# Altium footprint library Hydra_Ref_pcb.PcbLib: 353 footprints (part 6 of 23)
Each footprint in its own frame and in the unit in brackets; x right, y up, seen from the top. Pads: shape width x height; smd on the part's side, far side on the other; paste and mask are expansions set on the pad; w line width, h text height; cw(c..) or ccw(c..) is an arc to the next point about the centre after c.
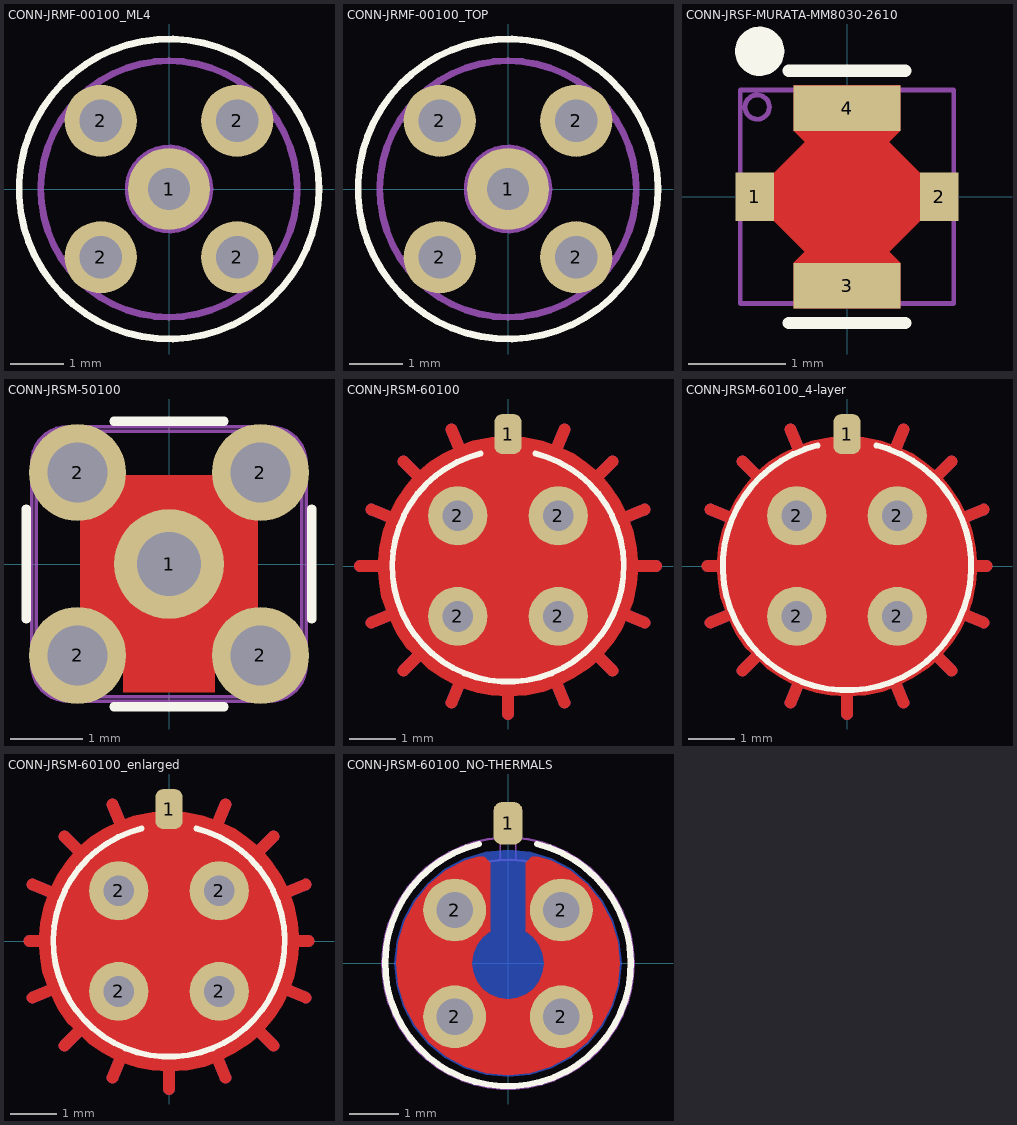
[diagram p5: the footprints below, top view; thin cyan lines are the x and y axes]

## CONN-JRMF-00100_ML4 [mil] "Straight PCB jack receptacle (MidLayer 4 routing)"
height 236.22
pads (5):
  round 60 / inner round 0 / far side round 60 hole 31 paste+0 mask+70: 1(0,0)
  round 53 / inner round 45 / far side oval 53x68 hole 31: 2(-50,-50) 2(-50,50) 2(50,-50) 2(50,50)
Top Overlay:
  circle w5: c0,0 r110
Internal Plane 1:
  lines w10: -78.28,-61.43 ccw(c-50,-50) -61.43,-78.28 ; -78.28,-38.57 cw(c-50,-50) -61.43,-21.72 ; -78.28,38.57 ccw(c-50,50) -61.43,21.72 ; -78.28,61.43 cw(c-50,50) -61.43,78.28 ; -38.57,-78.28 ccw(c-50,-50) -21.72,-61.43 ; -38.57,-21.72 cw(c-50,-50) -21.72,-38.57 ; -38.57,21.72 ccw(c-50,50) -21.72,38.57 ; -38.57,78.28 cw(c-50,50) -21.72,61.43 ; 21.72,-61.43 ccw(c50,-50) 38.57,-78.28 ; 21.72,-38.57 cw(c50,-50) 38.57,-21.72 ; 21.72,38.57 ccw(c50,50) 38.57,21.72 ; 21.72,61.43 cw(c50,50) 38.57,78.28 ; 61.43,-78.28 ccw(c50,-50) 78.28,-61.43 ; 61.43,-21.72 cw(c50,-50) 78.28,-38.57 ; 61.43,21.72 ccw(c50,50) 78.28,38.57 ; 61.43,78.28 cw(c50,50) 78.28,61.43
InternalPlane 3:
  lines w10: -78.28,-61.43 ccw(c-50,-50) -61.43,-78.28 ; -78.28,-38.57 cw(c-50,-50) -61.43,-21.72 ; -78.28,38.57 ccw(c-50,50) -61.43,21.72 ; -78.28,61.43 cw(c-50,50) -61.43,78.28 ; -38.57,-78.28 ccw(c-50,-50) -21.72,-61.43 ; -38.57,-21.72 cw(c-50,-50) -21.72,-38.57 ; -38.57,21.72 ccw(c-50,50) -21.72,38.57 ; -38.57,78.28 cw(c-50,50) -21.72,61.43 ; 21.72,-61.43 ccw(c50,-50) 38.57,-78.28 ; 21.72,-38.57 cw(c50,-50) 38.57,-21.72 ; 21.72,38.57 ccw(c50,50) 38.57,21.72 ; 21.72,61.43 cw(c50,50) 38.57,78.28 ; 61.43,-78.28 ccw(c50,-50) 78.28,-61.43 ; 61.43,-21.72 cw(c50,-50) 78.28,-38.57 ; 61.43,21.72 ccw(c50,50) 78.28,38.57 ; 61.43,78.28 cw(c50,50) 78.28,61.43
Internal Plane 4:
  lines w10: -78.28,-61.43 ccw(c-50,-50) -61.43,-78.28 ; -78.28,-38.57 cw(c-50,-50) -61.43,-21.72 ; -78.28,38.57 ccw(c-50,50) -61.43,21.72 ; -78.28,61.43 cw(c-50,50) -61.43,78.28 ; -38.57,-78.28 ccw(c-50,-50) -21.72,-61.43 ; -38.57,-21.72 cw(c-50,-50) -21.72,-38.57 ; -38.57,21.72 ccw(c-50,50) -21.72,38.57 ; -38.57,78.28 cw(c-50,50) -21.72,61.43 ; 21.72,-61.43 ccw(c50,-50) 38.57,-78.28 ; 21.72,-38.57 cw(c50,-50) 38.57,-21.72 ; 21.72,38.57 ccw(c50,50) 38.57,21.72 ; 21.72,61.43 cw(c50,50) 38.57,78.28 ; 61.43,-78.28 ccw(c50,-50) 78.28,-61.43 ; 61.43,-21.72 cw(c50,-50) 78.28,-38.57 ; 61.43,21.72 ccw(c50,50) 78.28,38.57 ; 61.43,78.28 cw(c50,50) 78.28,61.43
9 Top Assy:
  circle w5: c0,0 r94
  circle w5: c0,0 r30
  text ".Designator" at -85,110 h20
3D body: height 20, standoff 0, extent 30.16,-69.96 70.01,-30.03
3D body: height 20, standoff 0, extent -69.84,-69.96 -29.99,-30.03
3D body: height 20, standoff 0, extent 30.16,30.04 70.01,69.97
3D body: height 20, standoff 0, extent -69.84,30.04 -29.99,69.97
3D body: height 221, standoff 20, extent -94,-94 94,94

## CONN-JRMF-00100_TOP [mil] "Straight PCB jack receptacle - TOP routing"
height 236.22
pads (5):
  round 60 hole 31 paste+0 mask+70: 1(0,0)
  round 53 / inner round 45 / far side oval 53x68 hole 31: 2(-50,-50) 2(-50,50) 2(50,-50) 2(50,50)
Top Overlay:
  circle w5: c0,0 r110
InternalPlane 3:
  lines w10: -78.28,-61.43 ccw(c-50,-50) -61.43,-78.28 ; -78.28,-38.57 cw(c-50,-50) -61.43,-21.72 ; -78.28,38.57 ccw(c-50,50) -61.43,21.72 ; -78.28,61.43 cw(c-50,50) -61.43,78.28 ; -38.57,-78.28 ccw(c-50,-50) -21.72,-61.43 ; -38.57,-21.72 cw(c-50,-50) -21.72,-38.57 ; -38.57,21.72 ccw(c-50,50) -21.72,38.57 ; -38.57,78.28 cw(c-50,50) -21.72,61.43 ; 21.72,-61.43 ccw(c50,-50) 38.57,-78.28 ; 21.72,-38.57 cw(c50,-50) 38.57,-21.72 ; 21.72,38.57 ccw(c50,50) 38.57,21.72 ; 21.72,61.43 cw(c50,50) 38.57,78.28 ; 61.43,-78.28 ccw(c50,-50) 78.28,-61.43 ; 61.43,-21.72 cw(c50,-50) 78.28,-38.57 ; 61.43,21.72 ccw(c50,50) 78.28,38.57 ; 61.43,78.28 cw(c50,50) 78.28,61.43
Internal Plane 2:
  lines w10: -78.28,-61.43 ccw(c-50,-50) -61.43,-78.28 ; -78.28,-38.57 cw(c-50,-50) -61.43,-21.72 ; -78.28,38.57 ccw(c-50,50) -61.43,21.72 ; -78.28,61.43 cw(c-50,50) -61.43,78.28 ; -38.57,-78.28 ccw(c-50,-50) -21.72,-61.43 ; -38.57,-21.72 cw(c-50,-50) -21.72,-38.57 ; -38.57,21.72 ccw(c-50,50) -21.72,38.57 ; -38.57,78.28 cw(c-50,50) -21.72,61.43 ; 21.72,-61.43 ccw(c50,-50) 38.57,-78.28 ; 21.72,-38.57 cw(c50,-50) 38.57,-21.72 ; 21.72,38.57 ccw(c50,50) 38.57,21.72 ; 21.72,61.43 cw(c50,50) 38.57,78.28 ; 61.43,-78.28 ccw(c50,-50) 78.28,-61.43 ; 61.43,-21.72 cw(c50,-50) 78.28,-38.57 ; 61.43,21.72 ccw(c50,50) 78.28,38.57 ; 61.43,78.28 cw(c50,50) 78.28,61.43
Internal Plane 4:
  lines w10: -78.28,-61.43 ccw(c-50,-50) -61.43,-78.28 ; -78.28,-38.57 cw(c-50,-50) -61.43,-21.72 ; -78.28,38.57 ccw(c-50,50) -61.43,21.72 ; -78.28,61.43 cw(c-50,50) -61.43,78.28 ; -38.57,-78.28 ccw(c-50,-50) -21.72,-61.43 ; -38.57,-21.72 cw(c-50,-50) -21.72,-38.57 ; -38.57,21.72 ccw(c-50,50) -21.72,38.57 ; -38.57,78.28 cw(c-50,50) -21.72,61.43 ; 21.72,-61.43 ccw(c50,-50) 38.57,-78.28 ; 21.72,-38.57 cw(c50,-50) 38.57,-21.72 ; 21.72,38.57 ccw(c50,50) 38.57,21.72 ; 21.72,61.43 cw(c50,50) 38.57,78.28 ; 61.43,-78.28 ccw(c50,-50) 78.28,-61.43 ; 61.43,-21.72 cw(c50,-50) 78.28,-38.57 ; 61.43,21.72 ccw(c50,50) 78.28,38.57 ; 61.43,78.28 cw(c50,50) 78.28,61.43
9 Top Assy:
  circle w5: c0,0 r94
  circle w5: c0,0 r30
  text ".Designator" at -85,110 h20
3D body: height 20, standoff 0, extent 30.16,-69.96 70.01,-30.03
3D body: height 20, standoff 0, extent -69.84,-69.96 -29.99,-30.03
3D body: height 20, standoff 0, extent 30.16,30.04 70.01,69.97
3D body: height 20, standoff 0, extent -69.84,30.04 -29.99,69.97
3D body: height 221, standoff 20, extent -94,-94 94,94

## CONN-JRSF-MURATA-MM8030-2610 [mm] "SWG Type F SMT receptacle, integrated SPST switch"
height 0.9
pads (4):
  rect 0.4x0.5 smd paste-0.5 mask+0: 1(-0.95,0) 2(0.95,0)
  rect 1.1x0.47 smd paste-0.6 mask+0: 3(0,-0.915) 4(0,0.915)
Top Layer:
  region: 0.32,-1.15 0.32,1.15 -0.32,1.15 -0.32,-1.15
  pour cut-out: -0.75,-0.25 -0.45,-0.55 -0.425,-0.575 0.425,-0.575 0.75,-0.25 0.75,0.25 0.425,0.575 -0.425,0.575 -0.75,0.25
  region: -0.55,-1.15 -0.55,-0.68 -0.32,-0.45 0.32,-0.45 0.55,-0.68 0.55,-1.15
  region: 0.55,1.15 0.55,0.68 0.32,0.45 -0.32,0.45 -0.55,0.68 -0.55,1.15
Top Overlay:
  circle w0.254: c-0.9,1.5 r0.127
  lines w0.127: -0.6,-1.3 0.6,-1.3 ; -0.6,1.3 0.6,1.3
Top Paste:
  region: -0.5,1.15 -0.5,0.65 0.5,0.65 0.5,1.15
  region: 0.5,-1.15 0.5,-0.65 -0.5,-0.65 -0.5,-1.15
  region: 0.8,0.175 0.8,-0.175 1.15,-0.175 1.15,0.175
  region: -0.8,-0.175 -0.8,0.175 -1.15,0.175 -1.15,-0.175
9 Top Assy:
  circle w0.051: c-0.925,0.925 r0.125
  lines w0.051: -1.1,-1.1 -1.1,1.1 1.1,1.1 1.1,-1.1 -1.1,-1.1
  text ".Designator" at -0.95,-0.169 h0.51
3D body: height 0.47, standoff 0, extent -1.1,-1.1 1.1,1.1
3D body: height 0.99, standoff 0.54, extent -0.67,-0.674 0.675,0.674
3D body: height 1, standoff 0.99, extent -0.595,-0.599 0.6,0.599
3D body: height 0.48, standoff 0.47, extent -1.049,0.801 -0.801,1.049

## CONN-JRSM-50100 [mil] ".094 PCB-MALE"
height 194
pads (5):
  round 60 hole 35 paste-30: 1(0,0)
  round 53 / inner round 53 / far side oval 53x68 hole 33: 2(-50,-50) 2(-50,50) 2(50,-50) 2(50,50)
Top Layer:
  pour cut-out: 25,-70 25,48.41 -25,48.41 -25,-70
  pour cut-out: -48.41,-25 48.41,-25 48.41,25 -48.41,25
  pour cut-out: 0,48 4.73,48 14,46.16 22.74,42.54 30.6,37.28 37.28,30.6 42.54,22.74 46.16,14 48,4.73 48,0 48,-2 48,-6.73 46.16,-16 42.54,-24.74 37.28,-32.6 30.6,-39.28 22.74,-44.54 14,-48.16 4.73,-50 0,-50 -4.73,-50 -14,-48.16 -22.74,-44.54 -30.6,-39.28 -37.28,-32.6 -42.54,-24.74 -46.16,-16 -48,-6.73 -48,-2 -48,0 -48,4.73 -46.16,14 -42.54,22.74 -37.28,30.6 -30.6,37.28 -22.74,42.54 -14,46.16 -4.73,48
Mid-Layer 1:
  pour cut-out: -48.41,-25 48.41,-25 48.41,25 -48.41,25
  pour cut-out: 25,-50.41 25,48.41 -25,48.41 -25,-50.41
  pour cut-out: 0,48 4.73,48 14,46.16 22.74,42.54 30.6,37.28 37.28,30.6 42.54,22.74 46.16,14 48,4.73 48,0 48,-2 48,-6.73 46.16,-16 42.54,-24.74 37.28,-32.6 30.6,-39.28 22.74,-44.54 14,-48.16 4.73,-50 0,-50 -4.73,-50 -14,-48.16 -22.74,-44.54 -30.6,-39.28 -37.28,-32.6 -42.54,-24.74 -46.16,-16 -48,-6.73 -48,-2 -48,0 -48,4.73 -46.16,14 -42.54,22.74 -37.28,30.6 -30.6,37.28 -22.74,42.54 -14,46.16 -4.73,48
MidLayer3:
  pour cut-out: -48.41,-25 48.21,-25 48.21,25 -48.41,25
  pour cut-out: 25,-50.41 25,48.41 -25,48.41 -25,-50.41
  pour cut-out: 0,48 4.73,48 14,46.16 22.74,42.54 30.6,37.28 37.28,30.6 42.54,22.74 46.16,14 48,4.73 48,0 48,-2 48,-6.73 46.16,-16 42.54,-24.74 37.28,-32.6 30.6,-39.28 22.74,-44.54 14,-48.16 4.73,-50 0,-50 -4.73,-50 -14,-48.16 -22.74,-44.54 -30.6,-39.28 -37.28,-32.6 -42.54,-24.74 -46.16,-16 -48,-6.73 -48,-2 -48,0 -48,4.73 -46.16,14 -42.54,22.74 -37.28,30.6 -30.6,37.28 -22.74,42.54 -14,46.16 -4.73,48
MidLayer2:
  pour cut-out: -48.41,-18 48,-18 48,25 -48.41,25
  pour cut-out: 25,-50.41 25,48.41 -25,48.41 -25,-50.41
  pour cut-out: 0,48 4.73,48 14,46.16 22.74,42.54 30.6,37.28 37.28,30.6 42.54,22.74 46.16,14 48,4.73 48,0 48,-2 48,-6.73 46.16,-16 42.54,-24.74 37.28,-32.6 30.6,-39.28 22.74,-44.54 14,-48.16 4.73,-50 0,-50 -4.73,-50 -14,-48.16 -22.74,-44.54 -30.6,-39.28 -37.28,-32.6 -42.54,-24.74 -46.16,-16 -48,-6.73 -48,-2 -48,0 -48,4.73 -46.16,14 -42.54,22.74 -37.28,30.6 -30.6,37.28 -22.74,42.54 -14,46.16 -4.73,48
Bottom Layer:
  pour cut-out: -48.41,-18 48.21,-18 48.21,18 -48.41,18
  pour cut-out: 25,-50.41 25,48.41 -25,48.41 -25,-50.41
  pour cut-out: 0,48 4.73,48 14,46.16 22.74,42.54 30.6,37.28 37.28,30.6 42.54,22.74 46.16,14 48,4.73 48,0 48,-2 48,-6.73 46.16,-16 42.54,-24.74 37.28,-32.6 30.6,-39.28 22.74,-44.54 14,-48.16 4.73,-50 0,-50 -4.73,-50 -14,-48.16 -22.74,-44.54 -30.6,-39.28 -37.28,-32.6 -42.54,-24.74 -46.16,-16 -48,-6.73 -48,-2 -48,0 -48,4.73 -46.16,14 -42.54,22.74 -37.28,30.6 -30.6,37.28 -22.74,42.54 -14,46.16 -4.73,48
Top Overlay:
  lines w5: -78,-30 -78,30 ; -30,-78 30,-78 ; -30,78 30,78 ; 78,-30 78,30
Top Solder:
  rectangle: -82,-82 82,82
9 Top Assy:
  lines w2: -75,-55 ccw(c-55,-55) -55,-75 55,-75 ccw(c55,-55) 75,-55 75,55 ccw(c55,55) 55,75 -55.5,75 ccw(c-55.5,55.5) -75,55.5 -75,-55
  text ".Designator" at -65,-15 h38
13 Top 3D Bodies:
  lines w2: -72.5,-60 -72.5,60 -60,72.5 60,72.5 72.5,60 72.5,-60 60,-72.5 -60,-72.5 -72.5,-60
3D body: height 194, standoff 0, extent -72.5,-72.5 72.5,72.5
3D body: height 0, standoff -96, extent -59.98,40.02 -40.02,59.98
3D body: height 0, standoff -96, extent 40.02,40.02 59.98,59.98
3D body: height 0, standoff -96, extent -59.98,-59.98 -40.02,-40.02
3D body: height 0, standoff -96, extent 40.02,-59.98 59.98,-40.02
3D body: height 0, standoff -96, extent -11.98,-11.98 11.98,11.98

## CONN-JRSM-60100 [mil] ".063\" PCB ONLY-MALE COMPANAR SURFACE MOUNT"
height 150
pads (5):
  rrect60% 23x34 smd paste+0: 1(0,111.5)
  round 50 / inner round 50 / far side round 60 hole 26: 2(-42.5,-42.5) 2(-42.5,42.5) 2(42.5,-42.5) 2(42.5,42.5)
Top Layer:
  pour cut-out: 0,110 14,109 29,106 42,101.4 56,95 67,87 78,78 87,67 95,55 101.4,42 106,30 109,15 110,0 109,-15 106,-30 101.4,-42 96,-54 89,-65 78,-78 69,-86 55,-95 42,-101.4 30,-106 16,-109 0,-110 -14,-109 -26,-107 -42.25,-102 -57,-94 -67,-87 -77,-77 -86,-69 -94,-57 -101.4,-42 -107,-26 -109,-14 -110,0 -109,15 -106,29 -101.4,42 -95,55 -87,67 -78,78 -66,88 -55,95 -42,101.4 -30,106 -14,109
  region: -14,80 -19,85 -24,85 -34,82.08 -49.47,74.04 -62.96,62.96 -74.04,49.47 -82.26,34.08 -87.33,17.37 -89.04,0 -87.33,-17.37 -82.26,-34.08 -74.04,-49.47 -62.96,-62.96 -49.47,-74.04 -34.08,-82.26 -17.37,-87.33 0,-89.04 17.37,-87.33 34.08,-82.26 49.47,-74.04 62.96,-62.96 74.04,-49.47 82.26,-34.08 87.33,-17.37 89.04,0 87.33,17.37 82.26,34.08 74.04,49.47 62.96,62.96 49.47,74.04 34,82.08 24,85 19,85 14,80 14,25 20.32,20.51 24.88,14.56 27,8 28.73,0.2 27.75,-7.23 24.88,-14.16 20.32,-20.11 14.37,-24.68 7.44,-27.55 0,-28.53 -7.43,-27.55 -14.36,-24.68 -20.31,-20.11 -24.87,-14.16 -27.74,-7.23 -28.72,0.2 -27.74,7.63 -24.87,14.56 -20.31,20.51 -14,25
  region: 14,80 25,97 38.11,92 51,86 61,79 71,71 79,62 86,51 92,38.11 96,28 99,13 101,0 100,-12 97,-26 93,-38.52 87,-50 79,-61 71,-71 61,-79 52,-85 38.11,-92 26,-96 14,-99 0,-100 -13,-99 -25,-97 -38.52,-93 -49,-87 -60,-80 -71,-71 -79,-61 -87,-50 -92,-38.11 -97,-25 -99,-12 -100,0 -99,13 -97,25 -93,38.52 -87,49 -80,60 -71,71 -61,79 -49,87 -38.11,92 -25,97 -14,80 -14.1,25.18 -20.31,20.51 -24.87,14.56 -27.74,7.63 -28.72,0.2 -27.74,-7.23 -24.87,-14.16 -20.31,-20.11 -14.36,-24.68 -7.43,-27.55 0,-28.53 7.44,-27.55 14.37,-24.68 21,-20 24.88,-14.16 27.75,-7.23 28.73,0.2 27,8 24.88,14.56 20.32,20.51 14,25
  lines w10: -125,0 -56.21,0 ; -115.48,-47.84 -51.93,-21.51 ; -115.48,47.84 -51.93,21.51 ; -88.39,-88.39 -39.75,-39.75 ; -88.39,88.39 -39.75,39.75 ; -47.84,-115.48 -21.51,-51.93 ; -47.84,115.48 -21.51,51.93 ; 0,-125 0,-56.21 ; 21.51,-51.93 47.84,-115.48 ; 21.51,51.93 47.84,115.48 ; 39.75,-39.75 88.39,-88.39 ; 39.75,39.75 88.39,88.39 ; 51.93,-21.51 115.48,-47.84 ; 51.93,21.51 115.48,47.84 ; 56.21,0 125,0
Mid-Layer 1:
  pour cut-out: 98.9,0 97,-19.3 91.37,-37.85 82.23,-54.95 69.93,-69.94 54.94,-82.25 37.84,-91.39 19.28,-97.02 -0.01,-98.92 -19.31,-97.02 -37.87,-91.39 -54.97,-82.25 -69.96,-69.94 -82.26,-54.95 -91.4,-37.85 -97.03,-19.3 -98.93,0 -97.03,19.3 -91.4,37.85 -82.26,54.95 -69.96,69.94 -54.97,82.25 -37.87,91.39 -19.31,97.02 -0.01,98.92 19.28,97.02 37.84,91.39 54.94,82.25 69.93,69.94 82.23,54.95 91.37,37.85 97,19.3
  region: 0,90.44 -17.64,88.7 -34.61,83.55 -50.24,75.19 -63.95,63.95 -75.19,50.24 -83.55,34.61 -88.7,17.64 -90.44,0 -88.7,-17.64 -83.55,-34.61 -75.19,-50.24 -63.95,-63.95 -50.24,-75.19 -34.61,-83.55 -17.64,-88.7 0,-90.44 17.64,-88.7 34.61,-83.55 50.24,-75.19 63.95,-63.95 75.19,-50.24 83.55,-34.61 88.7,-17.64 90.44,0 88.7,17.64 83.55,34.61 75.19,50.24 63.95,63.95 50.24,75.19 34.61,83.55 17.64,88.7
  lines w10: -125,0 -56.21,0 ; -115.48,-47.84 -51.93,-21.51 ; -115.48,47.84 -51.93,21.51 ; -88.39,-88.39 -39.75,-39.75 ; -88.39,88.39 -39.75,39.75 ; -47.84,-115.48 -21.51,-51.93 ; -47.84,115.48 -21.51,51.93 ; 0,-125 0,-56.21 ; 0,60.1 0,112.2 ; 21.51,-51.93 47.84,-115.48 ; 21.51,51.93 47.84,115.48 ; 39.75,-39.75 88.39,-88.39 ; 39.75,39.75 88.39,88.39 ; 51.93,-21.51 115.48,-47.84 ; 51.93,21.51 115.48,47.84 ; 56.21,0 125,0
MidLayer3:
  pour cut-out: 98.9,0 97,-19.3 91.37,-37.85 82.23,-54.95 69.93,-69.94 54.94,-82.25 37.84,-91.39 19.28,-97.02 -0.01,-98.92 -19.31,-97.02 -37.87,-91.39 -54.97,-82.25 -69.96,-69.94 -82.26,-54.95 -91.4,-37.85 -97.03,-19.3 -98.93,0 -97.03,19.3 -91.4,37.85 -82.26,54.95 -69.96,69.94 -54.97,82.25 -37.87,91.39 -19.31,97.02 -0.01,98.92 19.28,97.02 37.84,91.39 54.94,82.25 69.93,69.94 82.23,54.95 91.37,37.85 97,19.3
  region: -14.03,87.66 -17.37,87.33 -34.08,82.26 -49.47,74.04 -62.96,62.96 -74.04,49.47 -82.26,34.08 -87.33,17.37 -89.04,0 -87.33,-17.37 -82.26,-34.08 -74.04,-49.47 -62.96,-62.96 -49.47,-74.04 -34.08,-82.26 -17.37,-87.33 0,-89.04 17.37,-87.33 34.08,-82.26 49.47,-74.04 62.96,-62.96 74.04,-49.47 82.26,-34.08 87.33,-17.37 89.04,0 87.33,17.37 82.26,34.08 74.04,49.47 62.96,62.96 49.47,74.04 34.08,82.26 17.37,87.33 14.03,87.66 14,87.5 14,25 14.11,25.18 14.37,25.08 20.32,20.51 24.88,14.56 27.75,7.63 28.73,0.2 27.75,-7.23 24.88,-14.16 20.32,-20.11 14.37,-24.68 7.44,-27.55 0,-28.53 -7.43,-27.55 -14.36,-24.68 -20.31,-20.11 -24.87,-14.16 -27.74,-7.23 -28.72,0.2 -27.74,7.63 -24.87,14.56 -20.31,20.51 -14.36,25.08 -14.1,25.18 -14,25
  region: 0,90.44 -17.64,88.7 -34.61,83.55 -50.24,75.19 -63.95,63.95 -75.19,50.24 -83.55,34.61 -88.7,17.64 -90.44,0 -88.7,-17.64 -83.55,-34.61 -75.19,-50.24 -63.95,-63.95 -50.24,-75.19 -34.61,-83.55 -17.64,-88.7 0,-90.44 17.64,-88.7 34.61,-83.55 50.24,-75.19 63.95,-63.95 75.19,-50.24 83.55,-34.61 88.7,-17.64 90.44,0 88.7,17.64 83.55,34.61 75.19,50.24 63.95,63.95 50.24,75.19 34.61,83.55 17.64,88.7
  lines w10: -125,0 -56.21,0 ; -115.48,-47.84 -51.93,-21.51 ; -115.48,47.84 -51.93,21.51 ; -88.39,-88.39 -39.75,-39.75 ; -88.39,88.39 -39.75,39.75 ; -47.84,-115.48 -21.51,-51.93 ; -47.84,115.48 -21.51,51.93 ; 0,-125 0,-56.21 ; 0,60.1 0,112.2 ; 21.51,-51.93 47.84,-115.48 ; 21.51,51.93 47.84,115.48 ; 39.75,-39.75 88.39,-88.39 ; 39.75,39.75 88.39,88.39 ; 51.93,-21.51 115.48,-47.84 ; 51.93,21.51 115.48,47.84 ; 56.21,0 125,0
Bottom Layer:
  pour cut-out: 98.9,0 97,-19.3 91.37,-37.85 82.23,-54.95 69.93,-69.94 54.94,-82.25 37.84,-91.39 19.28,-97.02 -0.01,-98.92 -19.31,-97.02 -37.87,-91.39 -54.97,-82.25 -69.96,-69.94 -82.26,-54.95 -91.4,-37.85 -97.03,-19.3 -98.93,0 -97.03,19.3 -91.4,37.85 -82.26,54.95 -69.96,69.94 -54.97,82.25 -37.87,91.39 -19.31,97.02 -0.01,98.92 19.28,97.02 37.84,91.39 54.94,82.25 69.93,69.94 82.23,54.95 91.37,37.85 97,19.3
  region: 0,90.44 -17.64,88.7 -34.61,83.55 -50.24,75.19 -63.95,63.95 -75.19,50.24 -83.55,34.61 -88.7,17.64 -90.44,0 -88.7,-17.64 -83.55,-34.61 -75.19,-50.24 -63.95,-63.95 -50.24,-75.19 -34.61,-83.55 -17.64,-88.7 0,-90.44 17.64,-88.7 34.61,-83.55 50.24,-75.19 63.95,-63.95 75.19,-50.24 83.55,-34.61 88.7,-17.64 90.44,0 88.7,17.64 83.55,34.61 75.19,50.24 63.95,63.95 50.24,75.19 34.61,83.55 17.64,88.7
  lines w10: -125,0 -56.21,0 ; -115.48,-47.84 -51.93,-21.51 ; -115.48,47.84 -51.93,21.51 ; -88.39,-88.39 -39.75,-39.75 ; -88.39,88.39 -39.75,39.75 ; -47.84,-115.48 -21.51,-51.93 ; -47.84,115.48 -21.51,51.93 ; 0,-125 0,-56.21 ; 0,60.1 0,112.2 ; 21.51,-51.93 47.84,-115.48 ; 21.51,51.93 47.84,115.48 ; 39.75,-39.75 88.39,-88.39 ; 39.75,39.75 88.39,88.39 ; 51.93,-21.51 115.48,-47.84 ; 51.93,21.51 115.48,47.84 ; 56.21,0 125,0
Top Overlay:
  lines w5: -23.04,95.05 ccw(c0,0) 23.04,95.05
Bottom Solder:
  circle w0.1: c0,0 r105
  lines w0.1: -23.59,103 -10,82
1 Board Outline:
  lines w0.1: 8.7,80 23.7,103
9 Top Assy:
  circle w2: c0,0 r82.5
  lines w1: -6,82.68 -6,114.17 6,114.17 6,82.68
  text ".Designator" at -70,-20.11 h40
13 Top 3D Bodies:
  circle w2: c0,0 r100
3D body: height 120, standoff 0, extent -99.98,-99.98 99.98,99.98

## CONN-JRSM-60100_4-layer [mil] ".063\" PCB ONLY-MALE COMPANAR SURFACE MOUNT"
height 150
pads (5):
  rrect60% 23x34 smd paste+0: 1(0,111.5)
  round 50 / inner round 50 / far side round 60 hole 26: 2(-42.5,-42.5) 2(-42.5,42.5) 2(42.5,-42.5) 2(42.5,42.5)
Top Layer:
  region: 14,80 25,97 38.11,92 51,86 61,79 71,71 79,62 86,51 92,38.11 96,28 99,13 101,0 100,-12 97,-26 93,-38.52 87,-50 79,-61 71,-71 61,-79 52,-85 38.11,-92 26,-96 14,-99 0,-100 -13,-99 -25,-97 -38.52,-93 -49,-87 -60,-80 -71,-71 -79,-61 -87,-50 -92,-38.11 -97,-25 -99,-12 -100,0 -99,13 -97,25 -93,38.52 -87,49 -80,60 -71,71 -61,79 -49,87 -38.11,92 -25,97 -14,80 -14.1,25.18 -20.31,20.51 -24.87,14.56 -27.74,7.63 -28.72,0.2 -27.74,-7.23 -24.87,-14.16 -20.31,-20.11 -14.36,-24.68 -7.43,-27.55 0,-28.53 7.44,-27.55 14.37,-24.68 21,-20 24.88,-14.16 27.75,-7.23 28.73,0.2 27,8 24.88,14.56 20.32,20.51 14,25
  region: -14,80 -19,85 -24,85 -34,82.08 -49.47,74.04 -62.96,62.96 -74.04,49.47 -82.26,34.08 -87.33,17.37 -89.04,0 -87.33,-17.37 -82.26,-34.08 -74.04,-49.47 -62.96,-62.96 -49.47,-74.04 -34.08,-82.26 -17.37,-87.33 0,-89.04 17.37,-87.33 34.08,-82.26 49.47,-74.04 62.96,-62.96 74.04,-49.47 82.26,-34.08 87.33,-17.37 89.04,0 87.33,17.37 82.26,34.08 74.04,49.47 62.96,62.96 49.47,74.04 34,82.08 24,85 19,85 14,80 14,25 20.32,20.51 24.88,14.56 27,8 28.73,0.2 27.75,-7.23 24.88,-14.16 20.32,-20.11 14.37,-24.68 7.44,-27.55 0,-28.53 -7.43,-27.55 -14.36,-24.68 -20.31,-20.11 -24.87,-14.16 -27.74,-7.23 -28.72,0.2 -27.74,7.63 -24.87,14.56 -20.31,20.51 -14,25
  pour cut-out: 0,110 14,109 29,106 42,101.4 56,95 67,87 78,78 87,67 95,55 101.4,42 106,30 109,15 110,0 109,-15 106,-30 101.4,-42 96,-54 89,-65 78,-78 69,-86 55,-95 42,-101.4 30,-106 16,-109 0,-110 -14,-109 -26,-107 -42.25,-102 -57,-94 -67,-87 -77,-77 -86,-69 -94,-57 -101.4,-42 -107,-26 -109,-14 -110,0 -109,15 -106,29 -101.4,42 -95,55 -87,67 -78,78 -66,88 -55,95 -42,101.4 -30,106 -14,109
  lines w10: -118,0 -56.21,0 ; -115.48,-47.84 -51.93,-21.51 ; -115.48,47.84 -51.93,21.51 ; -88.39,-88.39 -39.75,-39.75 ; -88.39,88.39 -39.75,39.75 ; -47.84,-115.48 -21.51,-51.93 ; -47.84,115.48 -21.51,51.93 ; 0,-125 0,-56.21 ; 21.51,-51.93 47.84,-115.48 ; 21.51,51.93 47.84,115.48 ; 39.75,-39.75 88.39,-88.39 ; 39.75,39.75 88.39,88.39 ; 51.93,-21.51 115.48,-47.84 ; 51.93,21.51 115.48,47.84 ; 56.21,0 117.99,0
Mid-Layer 1:
  region: 0,90.44 -17.64,88.7 -34.61,83.55 -50.24,75.19 -63.95,63.95 -75.19,50.24 -83.55,34.61 -88.7,17.64 -90.44,0 -88.7,-17.64 -83.55,-34.61 -75.19,-50.24 -63.95,-63.95 -50.24,-75.19 -34.61,-83.55 -17.64,-88.7 0,-90.44 17.64,-88.7 34.61,-83.55 50.24,-75.19 63.95,-63.95 75.19,-50.24 83.55,-34.61 88.7,-17.64 90.44,0 88.7,17.64 83.55,34.61 75.19,50.24 63.95,63.95 50.24,75.19 34.61,83.55 17.64,88.7
  pour cut-out: 98.9,0 97,-19.3 91.37,-37.85 82.23,-54.95 69.93,-69.94 54.94,-82.25 37.84,-91.39 19.28,-97.02 -0.01,-98.92 -19.31,-97.02 -37.87,-91.39 -54.97,-82.25 -69.96,-69.94 -82.26,-54.95 -91.4,-37.85 -97.03,-19.3 -98.93,0 -97.03,19.3 -91.4,37.85 -82.26,54.95 -69.96,69.94 -54.97,82.25 -37.87,91.39 -19.31,97.02 -0.01,98.92 19.28,97.02 37.84,91.39 54.94,82.25 69.93,69.94 82.23,54.95 91.37,37.85 97,19.3
  lines w10: -118,0 -56.21,0 ; -115.48,-47.84 -51.93,-21.51 ; -115.48,47.84 -51.93,21.51 ; -88.39,-88.39 -39.75,-39.75 ; -88.39,88.39 -39.75,39.75 ; -47.84,-115.48 -21.51,-51.93 ; -47.84,115.48 -21.51,51.93 ; 0,-125 0,-56.21 ; 0,60.1 0,112.2 ; 21.51,-51.93 47.84,-115.48 ; 21.51,51.93 47.84,115.48 ; 39.75,-39.75 88.39,-88.39 ; 39.75,39.75 88.39,88.39 ; 51.93,-21.51 115.48,-47.84 ; 51.93,21.51 115.48,47.84 ; 56.21,0 117.99,0
Bottom Layer:
  region: 0,90.44 -17.64,88.7 -34.61,83.55 -50.24,75.19 -63.95,63.95 -75.19,50.24 -83.55,34.61 -88.7,17.64 -90.44,0 -88.7,-17.64 -83.55,-34.61 -75.19,-50.24 -63.95,-63.95 -50.24,-75.19 -34.61,-83.55 -17.64,-88.7 0,-90.44 17.64,-88.7 34.61,-83.55 50.24,-75.19 63.95,-63.95 75.19,-50.24 83.55,-34.61 88.7,-17.64 90.44,0 88.7,17.64 83.55,34.61 75.19,50.24 63.95,63.95 50.24,75.19 34.61,83.55 17.64,88.7
  pour cut-out: 98.9,0 97,-19.3 91.37,-37.85 82.23,-54.95 69.93,-69.94 54.94,-82.25 37.84,-91.39 19.28,-97.02 -0.01,-98.92 -19.31,-97.02 -37.87,-91.39 -54.97,-82.25 -69.96,-69.94 -82.26,-54.95 -91.4,-37.85 -97.03,-19.3 -98.93,0 -97.03,19.3 -91.4,37.85 -82.26,54.95 -69.96,69.94 -54.97,82.25 -37.87,91.39 -19.31,97.02 -0.01,98.92 19.28,97.02 37.84,91.39 54.94,82.25 69.93,69.94 82.23,54.95 91.37,37.85 97,19.3
  lines w10: -118,0 -56.21,0 ; -115.48,-47.84 -51.93,-21.51 ; -115.48,47.84 -51.93,21.51 ; -88.39,-88.39 -39.75,-39.75 ; -88.39,88.39 -39.75,39.75 ; -47.84,-115.48 -21.51,-51.93 ; -47.84,115.48 -21.51,51.93 ; 0,-125 0,-56.21 ; 0,60.1 0,112.2 ; 21.51,-51.93 47.84,-115.48 ; 21.51,51.93 47.84,115.48 ; 39.75,-39.75 88.39,-88.39 ; 39.75,39.75 88.39,88.39 ; 51.93,-21.51 115.48,-47.84 ; 51.93,21.51 115.48,47.84 ; 56.21,0 117.99,0
Top Overlay:
  lines w5: -24.73,102.05 ccw(c0,0) 24.74,102.04
Top Solder:
  region: -9,92.9 -18.26,91.99 -35.81,86.66 -51.99,78.01 -66.18,66.38 -77.81,52.19 -86.46,36.01 -91.79,18.46 -93.59,0.2 -91.79,-18.06 -86.46,-35.61 -77.81,-51.79 -66.18,-65.98 -51.99,-77.61 -35.81,-86.26 -18.26,-91.59 0,-93.39 18.26,-91.59 35.81,-86.26 51.99,-77.61 66.18,-65.98 77.81,-51.79 86.46,-35.61 91.79,-18.06 93.59,0.2 91.79,18.46 86.46,36.01 77.81,52.19 66.18,66.38 51.99,78.01 35.81,86.66 18.26,91.99 8.99,92.9 9,92.9 9,22.09 9.17,22.51 16.93,17.33 22.12,9.56 23.94,0.4 22.12,-8.76 16.93,-16.53 9.16,-21.72 0,-23.54 -9.16,-21.72 -16.92,-16.53 -22.11,-8.76 -23.94,0.4 -22.11,9.56 -16.92,17.33 -9.17,22.51 -8.99,22.09 -9,22.1
  lines w20: -19.51,98.06 ccw(c0,0) 19.5,98.06
Internal Plane 1:
  lines w12: -93.35,-11.03 ccw(c0,0) -90.47,-25.53 ; -93.35,11.03 cw(c0,0) -90.47,25.53 ; -82.02,-45.91 ccw(c0,0) -73.81,-58.21 ; -82.02,45.92 cw(c0,0) -73.81,58.21 ; -58.21,-73.81 ccw(c0,0) -45.92,-82.02 ; -58.21,73.81 cw(c0,0) -55.31,76.01 ; -25.53,-90.47 ccw(c0,0) -11.03,-93.35 ; 11.03,-93.35 ccw(c0,0) 25.53,-90.47 ; 45.91,-82.02 ccw(c0,0) 58.21,-73.81 ; 55.3,76.01 cw(c0,0) 58.21,73.81 ; 73.81,-58.21 ccw(c0,0) 82.02,-45.92 ; 73.81,58.21 cw(c0,0) 82.02,45.91 ; 90.47,-25.53 ccw(c0,0) 93.35,-11.03 ; 90.47,25.53 cw(c0,0) 93.35,11.03
9 Top Assy:
  circle w2: c0,0 r82.5
  lines w1: -6,82.68 -6,114.17 6,114.17 6,82.68
  text ".Designator" at -70,-20.11 h40
13 Top 3D Bodies:
  circle w2.5: c0,0 r100
3D body: height 120, standoff 0, extent -99.98,-99.98 99.98,99.98

## CONN-JRSM-60100_enlarged [mil] ".063\" PCB ONLY-MALE COMPANAR SURFACE MOUNT"
height 150
pads (5):
  rrect60% 23x34 smd paste+0: 1(0,111.5)
  round 50 / inner round 50 / far side round 60 hole 26: 2(-42.5,-42.5) 2(-42.5,42.5) 2(42.5,-42.5) 2(42.5,42.5)
Top Layer:
  pour cut-out: 0,110 14,109 29,106 42,101.4 56,95 67,87 78,78 87,67 95,55 101.4,42 106,30 109,15 110,0 109,-15 106,-30 101.4,-42 96,-54 89,-65 78,-78 69,-86 55,-95 42,-101.4 30,-106 16,-109 0,-110 -14,-109 -26,-107 -42.25,-102 -57,-94 -67,-87 -77,-77 -86,-69 -94,-57 -101.4,-42 -107,-26 -109,-14 -110,0 -109,15 -106,29 -101.4,42 -95,55 -87,67 -78,78 -66,88 -55,95 -42,101.4 -30,106 -14,109
  region: -14,80 -19,85 -24,85 -34,82.08 -49.47,74.04 -62.96,62.96 -74.04,49.47 -82.26,34.08 -87.33,17.37 -89.04,0 -87.33,-17.37 -82.26,-34.08 -74.04,-49.47 -62.96,-62.96 -49.47,-74.04 -34.08,-82.26 -17.37,-87.33 0,-89.04 17.37,-87.33 34.08,-82.26 49.47,-74.04 62.96,-62.96 74.04,-49.47 82.26,-34.08 87.33,-17.37 89.04,0 87.33,17.37 82.26,34.08 74.04,49.47 62.96,62.96 49.47,74.04 34,82.08 24,85 19,85 14,80 14,25 20.32,20.51 24.88,14.56 27,8 28.73,0.2 27.75,-7.23 24.88,-14.16 20.32,-20.11 14.37,-24.68 7.44,-27.55 0,-28.53 -7.43,-27.55 -14.36,-24.68 -20.31,-20.11 -24.87,-14.16 -27.74,-7.23 -28.72,0.2 -27.74,7.63 -24.87,14.56 -20.31,20.51 -14,25
  region: 14,80 25,97 38.11,92 51,86 61,79 71,71 79,62 86,51 92,38.11 96,28 99,13 101,0 100,-12 97,-26 93,-38.52 87,-50 79,-61 71,-71 61,-79 52,-85 38.11,-92 26,-96 14,-99 0,-100 -13,-99 -25,-97 -38.52,-93 -49,-87 -60,-80 -71,-71 -79,-61 -87,-50 -92,-38.11 -97,-25 -99,-12 -100,0 -99,13 -97,25 -93,38.52 -87,49 -80,60 -71,71 -61,79 -49,87 -38.11,92 -25,97 -14,80 -14.1,25.18 -20.31,20.51 -24.87,14.56 -27.74,7.63 -28.72,0.2 -27.74,-7.23 -24.87,-14.16 -20.31,-20.11 -14.36,-24.68 -7.43,-27.55 0,-28.53 7.44,-27.55 14.37,-24.68 21,-20 24.88,-14.16 27.75,-7.23 28.73,0.2 27,8 24.88,14.56 20.32,20.51 14,25
  lines w10: -118,0 -56.21,0 ; -115.48,-47.84 -51.93,-21.51 ; -115.48,47.84 -51.93,21.51 ; -88.39,-88.39 -39.75,-39.75 ; -88.39,88.39 -39.75,39.75 ; -47.84,-115.48 -21.51,-51.93 ; -47.84,115.48 -21.51,51.93 ; 0,-125 0,-56.21 ; 21.51,-51.93 47.84,-115.48 ; 21.51,51.93 47.84,115.48 ; 39.75,-39.75 88.39,-88.39 ; 39.75,39.75 88.39,88.39 ; 51.93,-21.51 115.48,-47.84 ; 51.93,21.51 115.48,47.84 ; 56.21,0 117.99,0
Mid-Layer 1:
  pour cut-out: 98.9,0 97,-19.3 91.37,-37.85 82.23,-54.95 69.93,-69.94 54.94,-82.25 37.84,-91.39 19.28,-97.02 -0.01,-98.92 -19.31,-97.02 -37.87,-91.39 -54.97,-82.25 -69.96,-69.94 -82.26,-54.95 -91.4,-37.85 -97.03,-19.3 -98.93,0 -97.03,19.3 -91.4,37.85 -82.26,54.95 -69.96,69.94 -54.97,82.25 -37.87,91.39 -19.31,97.02 -0.01,98.92 19.28,97.02 37.84,91.39 54.94,82.25 69.93,69.94 82.23,54.95 91.37,37.85 97,19.3
  region: 0,90.44 -17.64,88.7 -34.61,83.55 -50.24,75.19 -63.95,63.95 -75.19,50.24 -83.55,34.61 -88.7,17.64 -90.44,0 -88.7,-17.64 -83.55,-34.61 -75.19,-50.24 -63.95,-63.95 -50.24,-75.19 -34.61,-83.55 -17.64,-88.7 0,-90.44 17.64,-88.7 34.61,-83.55 50.24,-75.19 63.95,-63.95 75.19,-50.24 83.55,-34.61 88.7,-17.64 90.44,0 88.7,17.64 83.55,34.61 75.19,50.24 63.95,63.95 50.24,75.19 34.61,83.55 17.64,88.7
  lines w10: -118,0 -56.21,0 ; -115.48,-47.84 -51.93,-21.51 ; -115.48,47.84 -51.93,21.51 ; -88.39,-88.39 -39.75,-39.75 ; -88.39,88.39 -39.75,39.75 ; -47.84,-115.48 -21.51,-51.93 ; -47.84,115.48 -21.51,51.93 ; 0,-125 0,-56.21 ; 0,60.1 0,112.2 ; 21.51,-51.93 47.84,-115.48 ; 21.51,51.93 47.84,115.48 ; 39.75,-39.75 88.39,-88.39 ; 39.75,39.75 88.39,88.39 ; 51.93,-21.51 115.48,-47.84 ; 51.93,21.51 115.48,47.84 ; 56.21,0 117.99,0
MidLayer3:
  region: 0,90.44 -17.64,88.7 -34.61,83.55 -50.24,75.19 -63.95,63.95 -75.19,50.24 -83.55,34.61 -88.7,17.64 -90.44,0 -88.7,-17.64 -83.55,-34.61 -75.19,-50.24 -63.95,-63.95 -50.24,-75.19 -34.61,-83.55 -17.64,-88.7 0,-90.44 17.64,-88.7 34.61,-83.55 50.24,-75.19 63.95,-63.95 75.19,-50.24 83.55,-34.61 88.7,-17.64 90.44,0 88.7,17.64 83.55,34.61 75.19,50.24 63.95,63.95 50.24,75.19 34.61,83.55 17.64,88.7
  region: -14.03,87.66 -17.37,87.33 -34.08,82.26 -49.47,74.04 -62.96,62.96 -74.04,49.47 -82.26,34.08 -87.33,17.37 -89.04,0 -87.33,-17.37 -82.26,-34.08 -74.04,-49.47 -62.96,-62.96 -49.47,-74.04 -34.08,-82.26 -17.37,-87.33 0,-89.04 17.37,-87.33 34.08,-82.26 49.47,-74.04 62.96,-62.96 74.04,-49.47 82.26,-34.08 87.33,-17.37 89.04,0 87.33,17.37 82.26,34.08 74.04,49.47 62.96,62.96 49.47,74.04 34.08,82.26 17.37,87.33 14.03,87.66 14,87.5 14,25 14.11,25.18 14.37,25.08 20.32,20.51 24.88,14.56 27.75,7.63 28.73,0.2 27.75,-7.23 24.88,-14.16 20.32,-20.11 14.37,-24.68 7.44,-27.55 0,-28.53 -7.43,-27.55 -14.36,-24.68 -20.31,-20.11 -24.87,-14.16 -27.74,-7.23 -28.72,0.2 -27.74,7.63 -24.87,14.56 -20.31,20.51 -14.36,25.08 -14.1,25.18 -14,25
  pour cut-out: 98.9,0 97,-19.3 91.37,-37.85 82.23,-54.95 69.93,-69.94 54.94,-82.25 37.84,-91.39 19.28,-97.02 -0.01,-98.92 -19.31,-97.02 -37.87,-91.39 -54.97,-82.25 -69.96,-69.94 -82.26,-54.95 -91.4,-37.85 -97.03,-19.3 -98.93,0 -97.03,19.3 -91.4,37.85 -82.26,54.95 -69.96,69.94 -54.97,82.25 -37.87,91.39 -19.31,97.02 -0.01,98.92 19.28,97.02 37.84,91.39 54.94,82.25 69.93,69.94 82.23,54.95 91.37,37.85 97,19.3
  lines w10: -118,0 -56.21,0 ; -115.48,-47.84 -51.93,-21.51 ; -115.48,47.84 -51.93,21.51 ; -88.39,-88.39 -39.75,-39.75 ; -88.39,88.39 -39.75,39.75 ; -47.84,-115.48 -21.51,-51.93 ; -47.84,115.48 -21.51,51.93 ; 0,-125 0,-56.21 ; 0,60.1 0,112.2 ; 21.51,-51.93 47.84,-115.48 ; 21.51,51.93 47.84,115.48 ; 39.75,-39.75 88.39,-88.39 ; 39.75,39.75 88.39,88.39 ; 51.93,-21.51 115.48,-47.84 ; 51.93,21.51 115.48,47.84 ; 56.21,0 117.99,0
MidLayer2:
  pour cut-out: 98.9,0 97,-19.3 91.37,-37.85 82.23,-54.95 69.93,-69.94 54.94,-82.25 37.84,-91.39 19.28,-97.02 -0.01,-98.92 -19.31,-97.02 -37.87,-91.39 -54.97,-82.25 -69.96,-69.94 -82.26,-54.95 -91.4,-37.85 -97.03,-19.3 -98.93,0 -97.03,19.3 -91.4,37.85 -82.26,54.95 -69.96,69.94 -54.97,82.25 -37.87,91.39 -19.31,97.02 -0.01,98.92 19.28,97.02 37.84,91.39 54.94,82.25 69.93,69.94 82.23,54.95 91.37,37.85 97,19.3
  region: -14.03,87.66 -17.37,87.33 -34.08,82.26 -49.47,74.04 -62.96,62.96 -74.04,49.47 -82.26,34.08 -87.33,17.37 -89.04,0 -87.33,-17.37 -82.26,-34.08 -74.04,-49.47 -62.96,-62.96 -49.47,-74.04 -34.08,-82.26 -17.37,-87.33 0,-89.04 17.37,-87.33 34.08,-82.26 49.47,-74.04 62.96,-62.96 74.04,-49.47 82.26,-34.08 87.33,-17.37 89.04,0 87.33,17.37 82.26,34.08 74.04,49.47 62.96,62.96 49.47,74.04 34.08,82.26 17.37,87.33 14.03,87.66 14,87.5 14,25 14.11,25.18 14.37,25.08 20.32,20.51 24.88,14.56 27.75,7.63 28.73,0.2 27.75,-7.23 24.88,-14.16 20.32,-20.11 14.37,-24.68 7.44,-27.55 0,-28.53 -7.43,-27.55 -14.36,-24.68 -20.31,-20.11 -24.87,-14.16 -27.74,-7.23 -28.72,0.2 -27.74,7.63 -24.87,14.56 -20.31,20.51 -14.36,25.08 -14.1,25.18 -14,25
  region: 0,90.44 -17.64,88.7 -34.61,83.55 -50.24,75.19 -63.95,63.95 -75.19,50.24 -83.55,34.61 -88.7,17.64 -90.44,0 -88.7,-17.64 -83.55,-34.61 -75.19,-50.24 -63.95,-63.95 -50.24,-75.19 -34.61,-83.55 -17.64,-88.7 0,-90.44 17.64,-88.7 34.61,-83.55 50.24,-75.19 63.95,-63.95 75.19,-50.24 83.55,-34.61 88.7,-17.64 90.44,0 88.7,17.64 83.55,34.61 75.19,50.24 63.95,63.95 50.24,75.19 34.61,83.55 17.64,88.7
  lines w10: -118,0 -56.21,0 ; -115.48,-47.84 -51.93,-21.51 ; -115.48,47.84 -51.93,21.51 ; -88.39,-88.39 -39.75,-39.75 ; -88.39,88.39 -39.75,39.75 ; -47.84,-115.48 -21.51,-51.93 ; -47.84,115.48 -21.51,51.93 ; 0,-125 0,-56.21 ; 0,60.1 0,112.2 ; 21.51,-51.93 47.84,-115.48 ; 21.51,51.93 47.84,115.48 ; 39.75,-39.75 88.39,-88.39 ; 39.75,39.75 88.39,88.39 ; 51.93,-21.51 115.48,-47.84 ; 51.93,21.51 115.48,47.84 ; 56.21,0 117.99,0
Bottom Layer:
  pour cut-out: 98.9,0 97,-19.3 91.37,-37.85 82.23,-54.95 69.93,-69.94 54.94,-82.25 37.84,-91.39 19.28,-97.02 -0.01,-98.92 -19.31,-97.02 -37.87,-91.39 -54.97,-82.25 -69.96,-69.94 -82.26,-54.95 -91.4,-37.85 -97.03,-19.3 -98.93,0 -97.03,19.3 -91.4,37.85 -82.26,54.95 -69.96,69.94 -54.97,82.25 -37.87,91.39 -19.31,97.02 -0.01,98.92 19.28,97.02 37.84,91.39 54.94,82.25 69.93,69.94 82.23,54.95 91.37,37.85 97,19.3
  region: 0,90.44 -17.64,88.7 -34.61,83.55 -50.24,75.19 -63.95,63.95 -75.19,50.24 -83.55,34.61 -88.7,17.64 -90.44,0 -88.7,-17.64 -83.55,-34.61 -75.19,-50.24 -63.95,-63.95 -50.24,-75.19 -34.61,-83.55 -17.64,-88.7 0,-90.44 17.64,-88.7 34.61,-83.55 50.24,-75.19 63.95,-63.95 75.19,-50.24 83.55,-34.61 88.7,-17.64 90.44,0 88.7,17.64 83.55,34.61 75.19,50.24 63.95,63.95 50.24,75.19 34.61,83.55 17.64,88.7
  lines w10: -118,0 -56.21,0 ; -115.48,-47.84 -51.93,-21.51 ; -115.48,47.84 -51.93,21.51 ; -88.39,-88.39 -39.75,-39.75 ; -88.39,88.39 -39.75,39.75 ; -47.84,-115.48 -21.51,-51.93 ; -47.84,115.48 -21.51,51.93 ; 0,-125 0,-56.21 ; 0,60.1 0,112.2 ; 21.51,-51.93 47.84,-115.48 ; 21.51,51.93 47.84,115.48 ; 39.75,-39.75 88.39,-88.39 ; 39.75,39.75 88.39,88.39 ; 51.93,-21.51 115.48,-47.84 ; 51.93,21.51 115.48,47.84 ; 56.21,0 117.99,0
Top Overlay:
  lines w5: -23.04,95.05 ccw(c0,0) 23.04,95.05
Top Solder:
  region: -9,92.9 -18.26,91.99 -35.81,86.66 -51.99,78.01 -66.18,66.38 -77.81,52.19 -86.46,36.01 -91.79,18.46 -93.59,0.2 -91.79,-18.06 -86.46,-35.61 -77.81,-51.79 -66.18,-65.98 -51.99,-77.61 -35.81,-86.26 -18.26,-91.59 0,-93.39 18.26,-91.59 35.81,-86.26 51.99,-77.61 66.18,-65.98 77.81,-51.79 86.46,-35.61 91.79,-18.06 93.59,0.2 91.79,18.46 86.46,36.01 77.81,52.19 66.18,66.38 51.99,78.01 35.81,86.66 18.26,91.99 8.99,92.9 9,92.9 9,22.09 9.17,22.51 16.93,17.33 22.12,9.56 23.94,0.4 22.12,-8.76 16.93,-16.53 9.16,-21.72 0,-23.54 -9.16,-21.72 -16.92,-16.53 -22.11,-8.76 -23.94,0.4 -22.11,9.56 -16.92,17.33 -9.17,22.51 -8.99,22.09 -9,22.1
  lines w12: -28.4,93.58 ccw(c0,0) 28.38,93.59
Internal Plane 1:
  lines w12: -93.35,-11.03 ccw(c0,0) -90.47,-25.53 ; -93.35,11.03 cw(c0,0) -90.47,25.53 ; -82.02,-45.91 ccw(c0,0) -73.81,-58.21 ; -82.02,45.92 cw(c0,0) -73.81,58.21 ; -58.21,-73.81 ccw(c0,0) -45.92,-82.02 ; -25.53,-90.47 ccw(c0,0) -11.03,-93.35 ; 11.03,-93.35 ccw(c0,0) 25.53,-90.47 ; 45.91,-82.02 ccw(c0,0) 58.21,-73.81 ; 73.81,-58.21 ccw(c0,0) 82.02,-45.92 ; 73.81,58.21 cw(c0,0) 82.02,45.91 ; 90.47,-25.53 ccw(c0,0) 93.35,-11.03 ; 90.47,25.53 cw(c0,0) 93.35,11.03
9 Top Assy:
  circle w2: c0,0 r82.5
  lines w1: -6,82.68 -6,114.17 6,114.17 6,82.68
  text ".Designator" at -70,-20.11 h40
13 Top 3D Bodies:
  circle w2: c0,0 r100
3D body: height 120, standoff 0, extent -99.98,-99.98 99.98,99.98

## CONN-JRSM-60100_NO-THERMALS [mil] ".063\" PCB ONLY-MALE COMPANAR SURFACE MOUNT, height .193'\" for SV Microvave (much taller)"
height 193
pads (5):
  rrect60% 23x34 smd paste+0: 1(0,111.5)
  round 50 / inner round 50 / far side round 60 hole 29: 2(-42.5,-42.5) 2(-42.5,42.5) 2(42.5,-42.5) 2(42.5,42.5)
Top Layer:
  region: -14,80 -19,85 -24,85 -34,82.08 -49.47,74.04 -62.96,62.96 -74.04,49.47 -82.26,34.08 -87.33,17.37 -89.04,0 -87.33,-17.37 -82.26,-34.08 -74.04,-49.47 -62.96,-62.96 -49.47,-74.04 -34.08,-82.26 -17.37,-87.33 0,-89.04 17.37,-87.33 34.08,-82.26 49.47,-74.04 62.96,-62.96 74.04,-49.47 82.26,-34.08 87.33,-17.37 89.04,0 87.33,17.37 82.26,34.08 74.04,49.47 62.96,62.96 49.47,74.04 34,82.08 24,85 19,85 14,80 14,25 14.11,25.18 14.37,25.08 20.32,20.51 24.88,14.56 27.75,7.63 28.73,0.2 27.75,-7.23 24.88,-14.16 20.32,-20.11 14.37,-24.68 7.44,-27.55 0,-28.53 -7.43,-27.55 -14.36,-24.68 -20.31,-20.11 -24.87,-14.16 -27.74,-7.23 -28.72,0.2 -27.74,7.63 -24.87,14.56 -20.31,20.51 -14.36,25.08 -14.1,25.18 -14,25
Mid-Layer 1:
  region: 0,90.44 -17.64,88.7 -34.61,83.55 -50.24,75.19 -63.95,63.95 -75.19,50.24 -83.55,34.61 -88.7,17.64 -90.44,0 -88.7,-17.64 -83.55,-34.61 -75.19,-50.24 -63.95,-63.95 -50.24,-75.19 -34.61,-83.55 -17.64,-88.7 0,-90.44 17.64,-88.7 34.61,-83.55 50.24,-75.19 63.95,-63.95 75.19,-50.24 83.55,-34.61 88.7,-17.64 90.44,0 88.7,17.64 83.55,34.61 75.19,50.24 63.95,63.95 50.24,75.19 34.61,83.55 17.64,88.7
MidLayer3:
  region: 0,90.44 -17.64,88.7 -34.61,83.55 -50.24,75.19 -63.95,63.95 -75.19,50.24 -83.55,34.61 -88.7,17.64 -90.44,0 -88.7,-17.64 -83.55,-34.61 -75.19,-50.24 -63.95,-63.95 -50.24,-75.19 -34.61,-83.55 -17.64,-88.7 0,-90.44 17.64,-88.7 34.61,-83.55 50.24,-75.19 63.95,-63.95 75.19,-50.24 83.55,-34.61 88.7,-17.64 90.44,0 88.7,17.64 83.55,34.61 75.19,50.24 63.95,63.95 50.24,75.19 34.61,83.55 17.64,88.7
  region: -14.03,87.66 -17.37,87.33 -34.08,82.26 -49.47,74.04 -62.96,62.96 -74.04,49.47 -82.26,34.08 -87.33,17.37 -89.04,0 -87.33,-17.37 -82.26,-34.08 -74.04,-49.47 -62.96,-62.96 -49.47,-74.04 -34.08,-82.26 -17.37,-87.33 0,-89.04 17.37,-87.33 34.08,-82.26 49.47,-74.04 62.96,-62.96 74.04,-49.47 82.26,-34.08 87.33,-17.37 89.04,0 87.33,17.37 82.26,34.08 74.04,49.47 62.96,62.96 49.47,74.04 34.08,82.26 17.37,87.33 14.03,87.66 14,87.5 14,25 14.11,25.18 14.37,25.08 20.32,20.51 24.88,14.56 27.75,7.63 28.73,0.2 27.75,-7.23 24.88,-14.16 20.32,-20.11 14.37,-24.68 7.44,-27.55 0,-28.53 -7.43,-27.55 -14.36,-24.68 -20.31,-20.11 -24.87,-14.16 -27.74,-7.23 -28.72,0.2 -27.74,7.63 -24.87,14.56 -20.31,20.51 -14.36,25.08 -14.1,25.18 -14,25
Bottom Layer:
  region: 0,90.44 -17.64,88.7 -34.61,83.55 -50.24,75.19 -63.95,63.95 -75.19,50.24 -83.55,34.61 -88.7,17.64 -90.44,0 -88.7,-17.64 -83.55,-34.61 -75.19,-50.24 -63.95,-63.95 -50.24,-75.19 -34.61,-83.55 -17.64,-88.7 0,-90.44 17.64,-88.7 34.61,-83.55 50.24,-75.19 63.95,-63.95 75.19,-50.24 83.55,-34.61 88.7,-17.64 90.44,0 88.7,17.64 83.55,34.61 75.19,50.24 63.95,63.95 50.24,75.19 34.61,83.55 17.64,88.7
Top Overlay:
  lines w5: -23.04,95.05 ccw(c0,0) 23.04,95.05
Top Solder:
  pour cut-out: -21.5,101.4 -21.84,121.6 -20.52,128.2 -16.79,133.79 -11.2,137.52 -4.6,138.84 -4.6,138.5 4.6,138.84 11.2,137.52 16.79,133.79 20.52,128.2 21.84,121.6 21.5,121.6 21.84,101.4 20.52,94.8 16.79,89.21 11.2,85.48 4.6,84.16 4.6,84.5 -4.6,84.16 -11.2,85.48 -16.79,89.21 -20.52,94.8 -21.84,101.4
  region: -8.91,81.59 -19.29,91.66 -35.73,86.67 -51.91,78.02 -66.09,66.39 -77.73,52.2 -86.38,36.02 -91.7,18.47 -93.5,0.21 -91.7,-18.05 -86.38,-35.6 -77.73,-51.78 -66.09,-65.97 -51.91,-77.6 -35.73,-86.25 -18.17,-91.58 0.09,-93.38 18.34,-91.58 35.9,-86.25 52.08,-77.6 66.26,-65.97 77.9,-51.78 86.55,-35.6 91.87,-18.05 93.67,0.21 91.87,18.47 86.55,36.02 77.9,52.2 66.26,66.39 52.08,78.02 35.9,86.67 19.32,91.7 9.09,81.65 9.09,22.61 17.02,17.34 22.21,9.57 24.03,0.41 22.21,-8.75 17.02,-16.52 9.25,-21.71 0.09,-23.53 -9.07,-21.71 -16.84,-16.52 -22.03,-8.75 -23.85,0.41 -22.03,9.57 -16.84,17.34 -9.08,22.52 -8.91,22.61
9 Top Assy:
  circle w2: c0,0 r82.5
  lines w1: -6,82.68 -6,114.17 6,114.17 6,82.68
  text ".Designator" at -70,-20.11 h40
13 Top 3D Bodies:
  circle w2: c0,0 r100
3D body: height 193, standoff 0, extent -99.98,-99.98 99.98,99.98